# Altium footprint library NXP_60_26022015.PCBLIB: 287 footprints (part 17 of 18)
Each footprint in its own frame and in the unit in brackets; x right, y up, seen from the top. Pads: shape width x height; smd on the part's side, far side on the other; paste and mask are expansions set on the pad; w line width, h text height; cw(c..) or ccw(c..) is an arc to the next point about the centre after c.
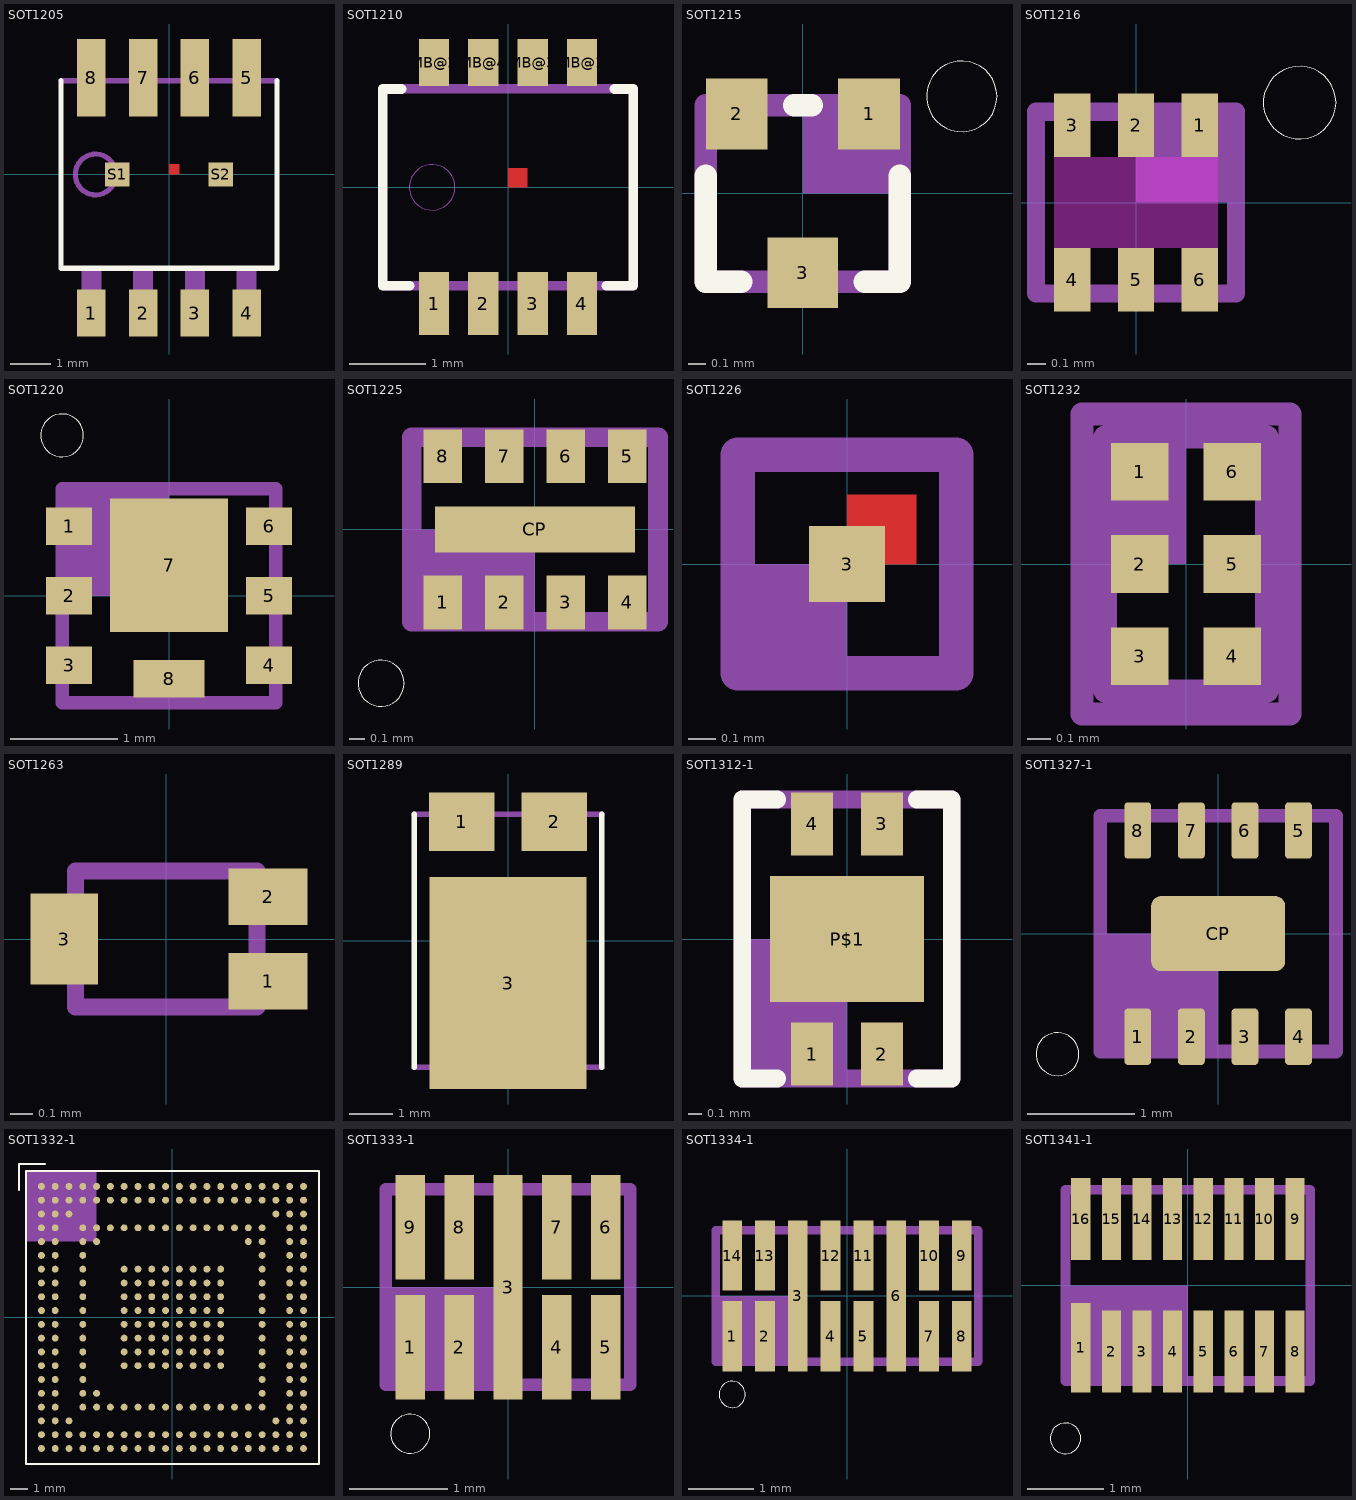
[diagram p16: the footprints below, top view; thin cyan lines are the x and y axes]

## SOT1205 [mil]
pads (10):
  rect 27.56x45.28 smd: 1(-75,-133.86) 2(-25,-133.86) 3(25,-133.86) 4(75,-133.86)
  rect 27.56x74.8 smd: 5(75,93.5) 6(25,93.5) 7(-25,93.5) 8(-75,93.5)
  rect 23.62x23.62 smd: S1(-50,0) S2(50,0)
Top Layer:
  region: 0,0 10,0 10,10 0,10
  region: 0,0 10,0 10,10 0,10
Top Overlay:
  lines w5: -104.33,90.55 -104.33,-90.55 104.33,-90.55 104.33,90.55
Top Paste:
  rectangle: -71.65,-73.82 -28.35,-34.45
  rectangle: 28.35,-73.82 71.65,-34.45
  rectangle: -71.65,-2.95 -28.35,36.42
  rectangle: 28.35,-2.95 71.65,36.42
Top Solder:
  rectangle: -91.24,-158.96 -58.76,-108.76
  rectangle: -41.24,-158.96 -8.76,-108.76
  rectangle: 8.76,-158.96 41.24,-108.76
  rectangle: 58.76,-158.96 91.24,-108.76
  region: 0,0 10,0 10,10 0,10
  region: 0,0 10,0 10,10 0,10
Mechanical 16:
  circle w5: c-70.87,0 r19.69
  rectangle: 65.35,-134.06 84.65,-90.74
  rectangle: 15.35,-134.06 34.65,-90.74
  rectangle: -34.65,-134.06 -15.35,-90.74
  rectangle: -34.65,90.55 -15.35,109.26
  rectangle: -84.65,90.55 -65.35,109.26
  rectangle: 15.35,90.55 34.65,109.26
  rectangle: 65.35,90.55 84.65,109.26
  rectangle: -84.65,-134.06 -65.35,-90.74
  lines w5: -104.33,90.55 104.33,90.55

## SOT1210 [mm]
pads (8):
  rect 0.4x0.83 smd: 1(-0.975,-1.535) 2(-0.325,-1.535) 3(0.325,-1.535) 4(0.975,-1.535)
  rect 0.4x0.62 smd: MB@1(0.975,1.645) MB@2(-0.975,1.645) MB@3(0.325,1.645) MB@4(-0.325,1.645)
Top Layer:
  region: 0,0 0.254,0 0.254,0.254 0,0.254
Top Overlay:
  lines w0.127: -1.65,-1.3 -1.65,1.296 ; -1.65,1.3 -1.65,1.296 ; -1.62,-1.3 -1.296,-1.3 ; -1.404,1.296 -1.65,1.296 ; 1.296,-1.3 1.62,-1.3 ; 1.404,1.296 1.65,1.296 ; 1.65,-1.3 1.65,1.296 ; 1.65,1.3 1.65,1.296
Top Paste:
  rectangle: 0.175,-1.95 0.475,-1.12
  rectangle: -0.475,-1.95 -0.175,-1.12
  rectangle: -1.125,-1.95 -0.825,-1.12
  rectangle: 0.825,-1.95 1.125,-1.12
  rectangle: 0.175,1.2 0.475,1.95
  rectangle: -0.475,1.2 -0.175,1.95
  rectangle: -1.125,1.2 -0.825,1.95
  rectangle: 0.825,1.2 1.125,1.95
  rectangle: 0.309,0.39 0.944,0.9
  rectangle: 0.309,-0.47 0.944,0.04
  rectangle: -0.944,-0.47 -0.309,0.04
  rectangle: -0.944,0.39 -0.309,0.9
Top Solder:
  rectangle: -1.225,-2 -0.725,-1.07
  rectangle: -0.575,-2 -0.075,-1.07
  rectangle: 0.075,-2 0.575,-1.07
  rectangle: 0.725,-2 1.225,-1.07
  region: 0,0 0.254,0 0.254,0.254 0,0.254
Mechanical 16:
  circle w0: c-1,0 r0.3
  lines w0.127: -1.65,-1.3 1.65,-1.3 ; -1.65,1.3 1.65,1.3

## SOT1215 [mm]
pads (3):
  rect 0.35x0.4 smd: 1(0.375,0.45) 2(-0.375,0.45)
  rect 0.4x0.4 smd: 3(0,-0.45)
Top Overlay:
  circle w0: c0.9,0.55 r0.2
  lines w0.127: -0.55,0.1 -0.55,-0.5 -0.35,-0.5 ; -0.05,0.5 0.05,0.5 ; 0.35,-0.5 0.55,-0.5 0.55,0.1
Top Paste:
  rectangle: -0.5,0.3 -0.25,0.6
  rectangle: 0.25,0.3 0.5,0.6
  rectangle: -0.15,-0.6 0.15,-0.3
Top Solder:
  rectangle: -0.6,0.2 -0.15,0.7
  rectangle: 0.15,0.2 0.6,0.7
  rectangle: -0.25,-0.7 0.25,-0.2
Mechanical 16:
  rectangle: 0,0 0.55,0.5
  lines w0.127: -0.55,-0.5 -0.55,0.5 0.55,0.5 0.55,-0.5 -0.55,-0.5

## SOT1216 [mm]
pads (6):
  rect 0.2x0.35 smd: 1(0.35,0.425) 2(0,0.425) 3(-0.35,0.425) 4(-0.35,-0.425) 5(0,-0.425) 6(0.35,-0.425)
Top Layer keep-out:
  rectangle: -0.45,-0.25 0.45,0.25
Top Overlay:
  circle w0: c0.9,0.55 r0.2
Top Paste:
  rectangle: -0.1,0.3 0.1,0.55
  rectangle: -0.45,0.3 -0.25,0.55
  rectangle: 0.25,0.3 0.45,0.55
  rectangle: -0.1,-0.55 0.1,-0.3
  rectangle: -0.45,-0.55 -0.25,-0.3
  rectangle: 0.25,-0.55 0.45,-0.3
Top Solder:
  rectangle: -0.15,0.25 0.15,0.6
  rectangle: -0.5,0.25 -0.2,0.6
  rectangle: 0.2,0.25 0.5,0.6
  rectangle: -0.15,-0.6 0.15,-0.25
  rectangle: -0.5,-0.6 -0.2,-0.25
  rectangle: 0.2,-0.6 0.5,-0.25
Mechanical 16:
  rectangle: 0,0 0.55,0.55
  lines w0.1: -0.55,-0.5 -0.55,0.5 0.55,0.5 0.55,-0.5 -0.55,-0.5

## SOT1220 [mm]
pads (8):
  rect 0.43x0.35 smd: 1(-0.935,0.65) 2(-0.935,0) 3(-0.935,-0.65) 4(0.935,-0.65) 5(0.935,0) 6(0.935,0.65)
  rect 1.1x1.25 smd: 7(0,0.285)
  rect 0.66x0.35 smd: 8(0,-0.775)
Top Overlay:
  circle w0: c-1,1.5 r0.2
Top Paste:
  rectangle: 0.77,-0.125 1.1,0.125
  rectangle: -1.1,-0.125 -0.77,0.125
  rectangle: 0.77,-0.775 1.1,-0.525
  rectangle: -1.1,-0.775 -0.77,-0.525
  rectangle: 0.77,0.525 1.1,0.775
  rectangle: -1.1,0.525 -0.77,0.775
  rectangle: -0.28,-0.9 0.28,-0.65
  rectangle: -0.45,-0.24 0.45,0.81
Top Solder:
  rectangle: 0.67,-0.225 1.2,0.225
  rectangle: -1.2,-0.225 -0.67,0.225
  rectangle: 0.67,-0.875 1.2,-0.425
  rectangle: -1.2,-0.875 -0.67,-0.425
  rectangle: 0.67,0.425 1.2,0.875
  rectangle: -1.2,0.425 -0.67,0.875
  rectangle: -0.38,-1 0.38,-0.55
  rectangle: -0.6,-0.39 0.6,0.96
Mechanical 16:
  rectangle: -1,0 0,1
  lines w0.127: -1,-1 1,-1 1,1 -1,1 -1,-1

## SOT1225 [mm]
pads (9):
  rect 0.25x0.35 smd: 1(-0.6,-0.475) 2(-0.2,-0.475) 3(0.2,-0.475) 4(0.6,-0.475) 5(0.6,0.475) 6(0.2,0.475) 7(-0.2,0.475) 8(-0.6,0.475)
  rect 1.3x0.3 smd: CP(0,0)
Top Overlay:
  circle w0: c-1,-1 r0.15
Top Paste:
  rectangle: -0.6,-0.1 -0.05,0.1
  rectangle: -0.7,0.325 -0.5,0.625
  rectangle: -0.3,0.325 -0.1,0.625
  rectangle: 0.1,0.325 0.3,0.625
  rectangle: 0.5,0.325 0.7,0.625
  rectangle: -0.7,-0.625 -0.5,-0.325
  rectangle: -0.3,-0.625 -0.1,-0.325
  rectangle: 0.1,-0.625 0.3,-0.325
  rectangle: 0.5,-0.625 0.7,-0.325
  rectangle: 0.05,-0.1 0.6,0.1
Top Solder:
  rectangle: -0.375,0.25 -0.025,0.7
  rectangle: -0.375,-0.7 -0.025,-0.25
  rectangle: -0.775,0.25 -0.425,0.7
  rectangle: -0.775,-0.7 -0.425,-0.25
  rectangle: 0.425,-0.7 0.775,-0.25
  rectangle: 0.025,0.25 0.375,0.7
  rectangle: 0.425,0.25 0.775,0.7
  rectangle: 0.025,-0.7 0.375,-0.25
  rectangle: -0.7,-0.2 0.7,0.2
Mechanical 16:
  rectangle: -0.8,-0.6 0,0
  lines w0.127: -0.8,-0.6 -0.8,0.6 0.8,0.6 0.8,-0.6 -0.8,-0.6

## SOT1226 [mm]
pads (5):
  rect 0x0 smd: 1(-0.3,-0.4) 2(0.3,-0.4) 4(0.3,0.4) 5(-0.3,0.4)
  rect 0.28x0.28 smd: 3(0,0)
Top Layer:
  region: 0,0 0.254,0 0.254,0.254 0,0.254
  region: 0,0 0.254,0 0.254,0.254 0,0.254
  region: 0,0 0.254,0 0.254,0.254 0,0.254
  region: 0,0 0.254,0 0.254,0.254 0,0.254
Top Paste:
  region: 0,0 0.254,0 0.254,0.254 0,0.254
  region: 0,0 0.254,0 0.254,0.254 0,0.254
  region: 0,0 0.254,0 0.254,0.254 0,0.254
  region: 0,0 0.254,0 0.254,0.254 0,0.254
  region: 0,0 0.254,0 0.254,0.254 0,0.254
Top Solder:
  rectangle: -0.45,-0.55 0.45,0.55
Mechanical 16:
  rectangle: -0.4,-0.4 0,0
  lines w0.127: -0.4,-0.4 0.4,-0.4 0.4,0.4 -0.4,0.4 -0.4,-0.4
  text "SOT1226" at -0.75,-1.25 h0.17

## SOT1232 [mm]
pads (6):
  rect 0.25x0.25 smd: 1(-0.2,0.4) 2(-0.2,0) 3(-0.2,-0.4) 4(0.2,-0.4) 5(0.2,0) 6(0.2,0.4)
Top Solder:
  rectangle: -0.375,-0.575 0.375,0.575
Mechanical 16:
  rectangle: -0.35,0 0,0.55
  lines w0.1: -0.35,-0.55 -0.35,0.55 0.35,0.55 0.35,-0.55 -0.35,-0.55
Mechanical 27:
  lines w0.1: -0.45,-0.65 -0.45,0.65 0.45,0.65 0.45,-0.65 -0.45,-0.65

## SOT1263 [mm]
pads (3):
  rect 0.35x0.25 smd: 1(0.45,-0.187) 2(0.45,0.187)
  rect 0.3x0.4 smd: 3(-0.45,0)
Top Paste:
  rectangle: 0.325,0.113 0.575,0.262
  rectangle: 0.325,-0.262 0.575,-0.113
  rectangle: -0.55,-0.15 -0.35,0.15
Top Solder:
  rectangle: 0.225,-0.362 0.675,0.362
  rectangle: -0.65,-0.25 -0.25,0.25
Mechanical 16:
  rectangle: 0.4,0.077 0.5,0.297
  rectangle: 0.4,-0.297 0.5,-0.077
  rectangle: -0.5,-0.11 -0.4,0.11
  lines w0.075: -0.4,-0.3 0.4,-0.3 0.4,0.3 -0.4,0.3 -0.4,-0.3
  text "SOT1263" at -0.5,-0.75 h0.17

## SOT1289 [mm]
pads (3):
  rect 1.5x1.34 smd: 1(-1.065,2.73) 2(1.065,2.73)
  rect 3.6x4.86 smd: 3(0,-0.97)
Top Overlay:
  lines w0.127: -2.15,-2.9 -2.15,2.9 ; 2.15,-2.9 2.15,2.9
Top Paste:
  rectangle: -1.765,2.11 -0.365,3.35
  rectangle: 0.365,2.11 1.765,3.35
  rectangle: -1.7,-0.55 -0.1,1.35
  rectangle: 0.1,-0.55 1.7,1.35
  rectangle: -1.7,-2.65 -0.1,-0.75
  rectangle: 0.1,-2.65 1.7,-0.75
  rectangle: -1.2,-3.35 1.2,-2.85
Mechanical 16:
  rectangle: -1,-3.25 1,-2.9
  region: 0,0 0.254,0 0.254,0.254 0,0.254
  region: 0,0 0.254,0 0.254,0.254 0,0.254
  lines w0.127: -2.15,-2.9 2.15,-2.9 ; -2.15,2.9 2.15,2.9

## SOT1312-1 [mm]
pads (5):
  rect 0.3x0.45 smd: 1(-0.25,-0.825) 2(0.25,-0.825) 3(0.25,0.825) 4(-0.25,0.825)
  rect 1.1x0.9 smd: P$1(0,0)
Top Overlay:
  lines w0.127: -0.5,-1 -0.75,-1 -0.75,1 -0.5,1 ; 0.5,-1 0.75,-1 0.75,1 0.5,1
Top Paste:
  rectangle: -0.375,-1.025 -0.125,-0.625
  rectangle: 0.125,-1.025 0.375,-0.625
  rectangle: 0.125,0.625 0.375,1.025
  rectangle: -0.375,0.625 -0.125,1.025
  rectangle: -0.5,-0.4 -0.05,-0.05
  rectangle: 0.05,0.05 0.5,0.4
  rectangle: 0.05,-0.4 0.5,-0.05
  rectangle: -0.5,0.05 -0.05,0.4
Top Solder:
  rectangle: -0.425,-1.075 0.425,-0.575
  rectangle: -0.425,0.575 0.425,1.075
  rectangle: -0.575,-0.475 0.575,0.475
Mechanical 16:
  rectangle: -0.75,-1 0,0
  lines w0.127: -0.75,-1 -0.75,1 0.75,1 0.75,-1 -0.75,-1

## SOT1327-1 [mm]
pads (9):
  rrect25% 0.25x0.525 smd: 1(-0.75,-0.962) 2(-0.25,-0.962) 3(0.25,-0.962) 4(0.75,-0.962) 5(0.75,0.962) 6(0.25,0.962) 7(-0.25,0.962) 8(-0.75,0.962)
  rrect25% 1.25x0.7 smd: CP(0,0)
Top Overlay:
  circle w0: c-1.5,-1.125 r0.2
Top Paste:
  rectangle: -0.35,0.725 -0.15,1.2
  rectangle: -0.85,0.725 -0.65,1.2
  rectangle: 0.15,0.725 0.35,1.2
  rectangle: 0.65,-1.2 0.85,-0.725
  rectangle: 0.15,-1.2 0.35,-0.725
  rectangle: -0.35,-1.2 -0.15,-0.725
  rectangle: -0.85,-1.2 -0.65,-0.725
  rectangle: 0.65,0.725 0.85,1.2
  rectangle: -0.3,-0.175 0.23,0.175
Top Solder:
  region: 0,0 0.254,0 0.254,0.254 0,0.254
Mechanical 16:
  rectangle: -1.125,-1.125 0,0
  lines w0.127: -1.1,-1.1 1.1,-1.1 1.1,1.1 -1.1,1.1 -1.1,-1.1

## SOT1332-1 [mm]
pads (267):
  rrect100% 0.4x0.4 smd: A1(-7.6,7.6) A2(-6.8,7.6) A3(-6,7.6) A4(-5.2,7.6) A5(-4.4,7.6) A6(-3.6,7.6) A7(-2.8,7.6) A8(-2,7.6) A9(-1.2,7.6) A10(-0.4,7.6) A11(0.4,7.6) A12(1.2,7.6) A13(2,7.6) A14(2.8,7.6) A15(3.6,7.6) A16(4.4,7.6) A17(5.2,7.6) A18(6,7.6) A19(6.8,7.6) A20(7.6,7.6) B1(-7.6,6.8) B2(-6.8,6.8) B3(-6,6.8) B4(-5.2,6.8) B5(-4.4,6.8) B6(-3.6,6.8) B7(-2.8,6.8) B8(-2,6.8) B9(-1.2,6.8) B10(-0.4,6.8) B11(0.4,6.8) B12(1.2,6.8) B13(2,6.8) B14(2.8,6.8) B15(3.6,6.8) B16(4.4,6.8) B17(5.2,6.8) B18(6,6.8) B19(6.8,6.8) B20(7.6,6.8) C1(-7.6,6) C2(-6.8,6) C3(-6,6) C18(6,6) C19(6.8,6) C20(7.6,6) D1(-7.6,5.2) D2(-6.8,5.2) D4(-5.2,5.2) D5(-4.4,5.2) D6(-3.6,5.2) D7(-2.8,5.2) D8(-2,5.2) D9(-1.2,5.2) D10(-0.4,5.2) D11(0.4,5.2) D12(1.2,5.2) D13(2,5.2) D14(2.8,5.2) D15(3.6,5.2) D16(4.4,5.2) D17(5.2,5.2) D19(6.8,5.2) D20(7.6,5.2) E1(-7.6,4.4) E2(-6.8,4.4) E4(-5.2,4.4) E5(-4.4,4.4) E16(4.4,4.4) E17(5.2,4.4) E19(6.8,4.4) E20(7.6,4.4) F1(-7.6,3.6) F2(-6.8,3.6) F4(-5.2,3.6) F16(5.2,3.6) F18(6.8,3.6) F19(7.6,3.6) G1(-7.6,2.8) G2(-6.8,2.8) G4(-5.2,2.8) G7(-2.8,2.8) G8(-2,2.8) G9(-1.2,2.8) G10(-0.4,2.8) G11(0.4,2.8) G12(1.2,2.8) G13(2,2.8) G14(2.8,2.8) G16(5.2,2.8) G18(6.8,2.8) G19(7.6,2.8) H1(-7.6,2) H2(-6.8,2) H4(-5.2,2) H7(-2.8,2) H8(-2,2) H9(-1.2,2) H10(-0.4,2) H11(0.4,2) H12(1.2,2) H13(2,2) H14(2.8,2) H16(5.2,2) H18(6.8,2) H19(7.6,2) J1(-7.6,1.2) J2(-6.8,1.2) J4(-5.2,1.2) J7(-2.8,1.2) J8(-2,1.2) J9(-1.2,1.2) J10(-0.4,1.2) J11(0.4,1.2) J12(1.2,1.2) J13(2,1.2) J14(2.8,1.2) J16(5.2,1.2) J18(6.8,1.2) J19(7.6,1.2) K1(-7.6,0.4) K2(-6.8,0.4) K4(-5.2,0.4) K7(-2.8,0.4) K8(-2,0.4) K9(-1.2,0.4) K10(-0.4,0.4) K11(0.4,0.4) K12(1.2,0.4) K13(2,0.4) K14(2.8,0.4) K17(5.2,0.4) K19(6.8,0.4) K20(7.6,0.4) L1(-7.6,-0.4) L2(-6.8,-0.4) L4(-5.2,-0.4) L7(-2.8,-0.4) L8(-2,-0.4) L9(-1.2,-0.4) L10(-0.4,-0.4) L11(0.4,-0.4) L12(1.2,-0.4) L13(2,-0.4) L14(2.8,-0.4) L17(5.2,-0.4) L19(6.8,-0.4) L20(7.6,-0.4) M1(-7.6,-1.2) M2(-6.8,-1.2) M4(-5.2,-1.2) M7(-2.8,-1.2) M8(-2,-1.2) M9(-1.2,-1.2) M10(-0.4,-1.2) M11(0.4,-1.2) M12(1.2,-1.2) M13(2,-1.2) M14(2.8,-1.2) M17(5.2,-1.2) M19(6.8,-1.2) M20(7.6,-1.2) N1(-7.6,-2) N2(-6.8,-2) N4(-5.2,-2) N7(-2.8,-2) N8(-2,-2) N9(-1.2,-2) N10(-0.4,-2) N11(0.4,-2) N12(1.2,-2) N13(2,-2) N14(2.8,-2) N17(5.2,-2) N19(6.8,-2) N20(7.6,-2) P1(-7.6,-2.8) P2(-6.8,-2.8) P4(-5.2,-2.8) P7(-2.8,-2.8) P8(-2,-2.8) P9(-1.2,-2.8) P10(-0.4,-2.8) P11(0.4,-2.8) P12(1.2,-2.8) P13(2,-2.8) P14(2.8,-2.8) P17(5.2,-2.8) P19(6.8,-2.8) P20(7.6,-2.8) R1(-7.6,-3.6) R2(-6.8,-3.6) R4(-5.2,-3.6) R17(5.2,-3.6) R19(6.8,-3.6) R20(7.6,-3.6) T1(-7.6,-4.4) T2(-6.8,-4.4) T4(-5.2,-4.4) T5(-4.4,-4.4) T17(5.2,-4.4) T19(6.8,-4.4) T20(7.6,-4.4) U1(-7.6,-5.2) U2(-6.8,-5.2) U4(-5.2,-5.2) U5(-4.4,-5.2) U6(-3.6,-5.2) U7(-2.8,-5.2) U8(-2,-5.2) U9(-1.2,-5.2) U10(-0.4,-5.2) U11(0.4,-5.2) U12(1.2,-5.2) U13(2,-5.2) U14(2.8,-5.2) U15(3.6,-5.2) U16(4.4,-5.2) U17(5.2,-5.2) U19(6.8,-5.2) U20(7.6,-5.2) V1(-7.6,-6) V2(-6.8,-6) V3(-6,-6) V18(6,-6) V19(6.8,-6) V20(7.6,-6) W1(-7.6,-6.8) W2(-6.8,-6.8) W3(-6,-6.8) W4(-5.2,-6.8) W5(-4.4,-6.8) W6(-3.6,-6.8) W7(-2.8,-6.8) W8(-2,-6.8) W9(-1.2,-6.8) W10(-0.4,-6.8) W11(0.4,-6.8) W12(1.2,-6.8) W13(2,-6.8) W14(2.8,-6.8) W15(3.6,-6.8) W16(4.4,-6.8) W17(5.2,-6.8) W18(6,-6.8) W19(6.8,-6.8) W20(7.6,-6.8) Y1(-7.6,-7.6) Y2(-6.8,-7.6) Y3(-6,-7.6) Y4(-5.2,-7.6) Y5(-4.4,-7.6) Y6(-3.6,-7.6) Y7(-2.8,-7.6) Y8(-2,-7.6) Y9(-1.2,-7.6) Y10(-0.4,-7.6) Y11(0.4,-7.6) Y12(1.2,-7.6) Y13(2,-7.6) Y14(2.8,-7.6) Y15(3.6,-7.6) Y16(4.4,-7.6) Y17(5.2,-7.6) Y18(6,-7.6) Y19(6.8,-7.6) Y20(7.6,-7.6)
Top Overlay:
  lines w0.127: -8.9,7.4 -8.9,8.9 -7.4,8.9 ; -8.5,-8.5 -8.5,8.5 8.5,8.5 8.5,-8.5 -8.5,-8.5
Top Solder:
  drawing of 267 lines, arcs and shapes, not listed
Mechanical 16:
  rectangle: -8.5,4.4 -4.4,8.5

## SOT1333-1 [mm]
pads (9):
  rect 0.3x1.07 smd: 1(-1,-0.615) 2(-0.5,-0.615) 4(0.5,-0.615) 5(1,-0.615) 6(1,0.615) 7(0.5,0.615) 8(-0.5,0.615) 9(-1,0.615)
  rect 0.3x2.3 smd: 3(0,0)
Top Overlay:
  circle w0: c-1,-1.5 r0.2
Mechanical 16:
  rectangle: -1.25,-1 0,0
  lines w0.127: -1.25,-1 -1.25,1 1.25,1 1.25,-1 -1.25,-1

## SOT1334-1 [mm]
pads (14):
  rect 0.3x1.07 smd: 1(-1.75,-0.615) 2(-1.25,-0.615) 4(-0.25,-0.615) 5(0.25,-0.615) 7(1.25,-0.615) 8(1.75,-0.615) 9(1.75,0.615) 10(1.25,0.615) 11(0.25,0.615) 12(-0.25,0.615) 13(-1.25,0.615) 14(-1.75,0.615)
  rect 0.3x2.3 smd: 3(-0.75,0) 6(0.75,0)
Top Overlay:
  circle w0: c-1.75,-1.5 r0.2
Mechanical 16:
  rectangle: -2,-1 -0.75,0
  lines w0.127: -2,-1 -2,1 2,1 2,-1 -2,-1

## SOT1341-1 [mm]
pads (16):
  rect 0.25x1.17 smd: 1(-1.4,-0.815)
  rect 0.25x1.07 smd: 2(-1,-0.865) 3(-0.6,-0.865) 4(-0.2,-0.865) 5(0.2,-0.865) 6(0.6,-0.865) 7(1,-0.865) 8(1.4,-0.865) 9(1.4,0.865) 10(1,0.865) 11(0.6,0.865) 12(0.2,0.865) 13(-0.2,0.865) 14(-0.6,0.865) 15(-1,0.865) 16(-1.4,0.865)
Top Overlay:
  circle w0: c-1.6,-2 r0.2
Top Solder:
  rectangle: -1.575,0.28 1.575,1.45
  rectangle: -1.2,-1.45 1.575,-0.28
  rectangle: -1.575,-1.45 -1.2,-0.18
Mechanical 16:
  rectangle: -1.6,-1.2 0,0
  lines w0.127: -1.6,-1.25 1.6,-1.25 1.6,1.25 -1.6,1.25 -1.6,-1.25